# Altium footprint library LED.PcbLib: 49 footprints (part 2 of 4)
Each footprint in its own frame and in the unit in brackets; x right, y up, seen from the top. Pads: shape width x height; smd on the part's side, far side on the other; paste and mask are expansions set on the pad; w line width, h text height; cw(c..) or ccw(c..) is an arc to the next point about the centre after c.
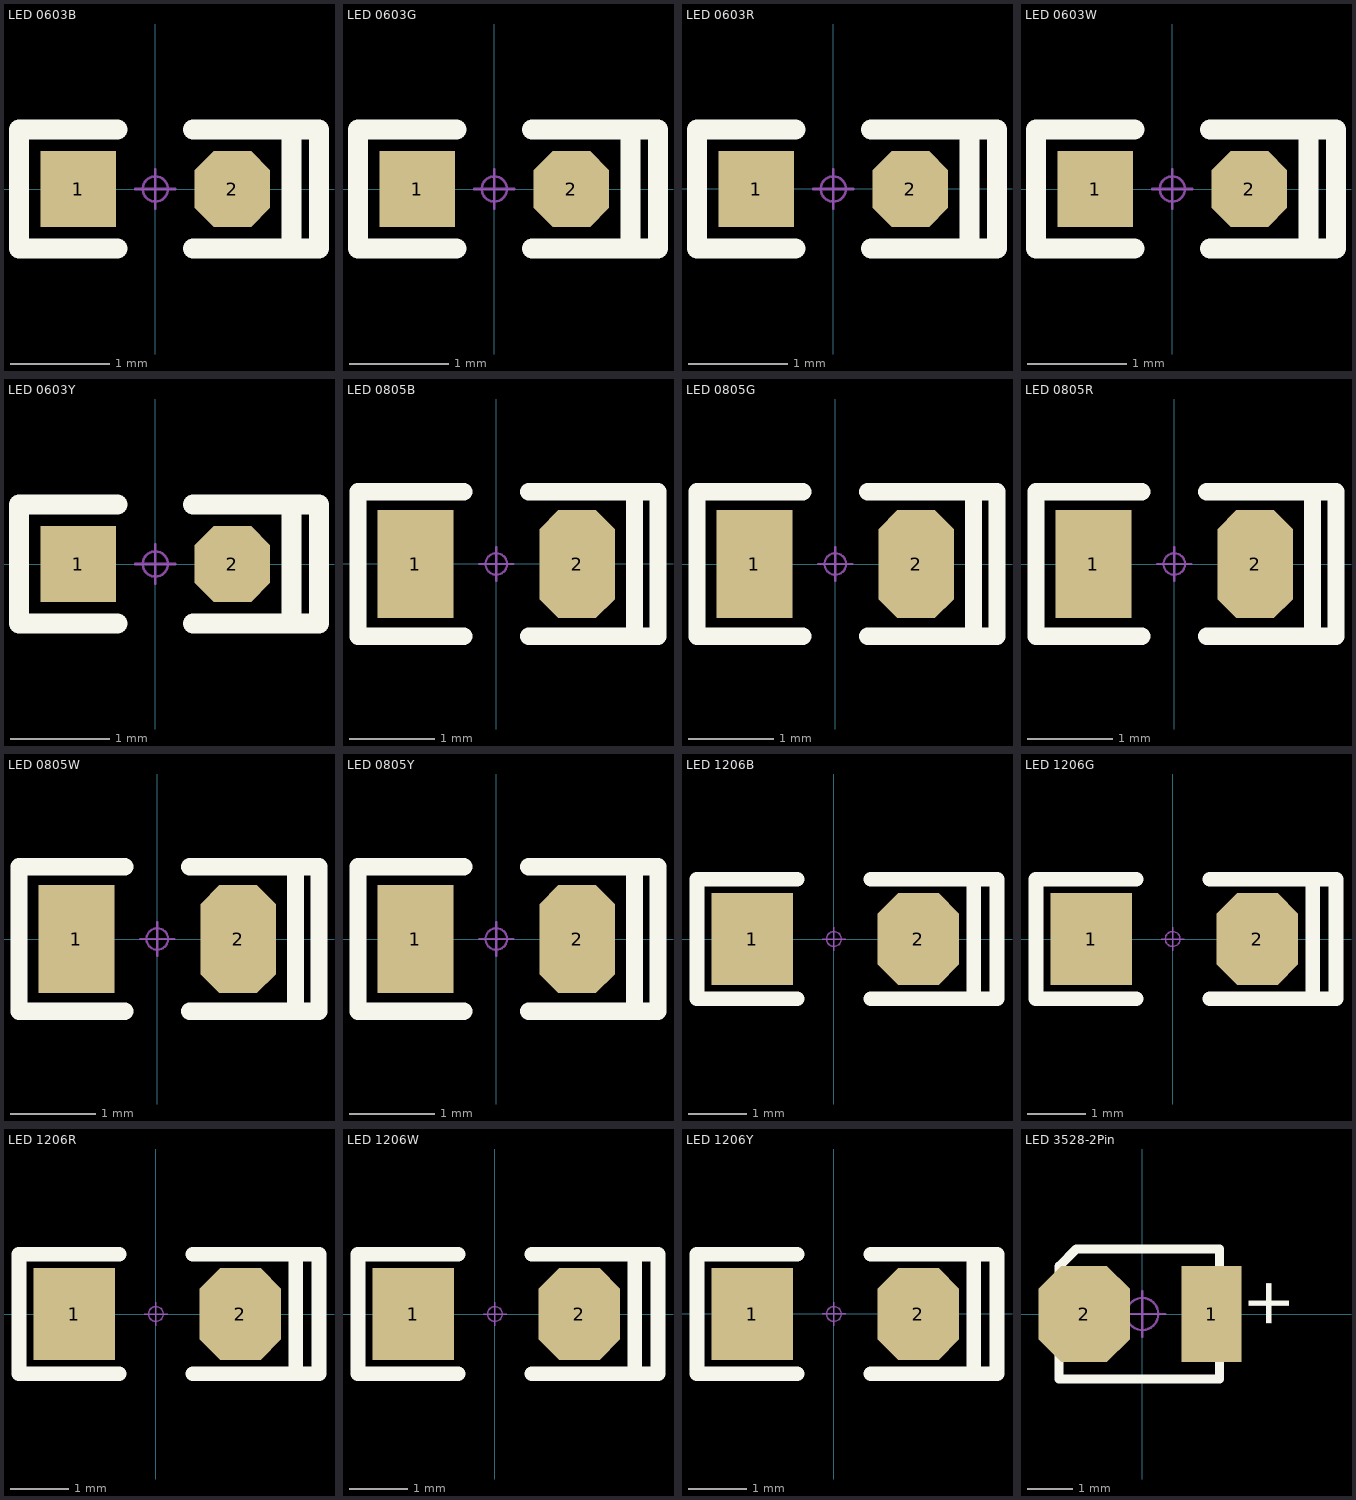
[diagram p1: the footprints below, top view; thin cyan lines are the x and y axes]

## LED 0603B [mil] "蓝色0603LED"
pads (2):
  rect 30x30 smd: 1(-30.59,0)
  oct 30x30 smd: 2(30.59,0)
Top Overlay:
  lines w8: -15,-23.62 -54.13,-23.62 -54.13,23.62 -15,23.62 ; 15,-23.62 65,-23.62 65,23.62 15,23.62 ; 54.13,-23.62 54.13,23.62
Mechanical 15:
  circle w1: c0,0 r5
  lines w1: -7.87,0 7.87,0 ; 0,-7.87 0,7.88
3D body: height 23.82, standoff 8.07, extent -23.63,-15.75 23.62,15.75
3D body: height 18.36, standoff -0.16, extent -31.49,-15.78 31.5,15.79

## LED 0603G [mil] "绿色0603LED"
pads (2):
  rect 30x30 smd: 1(-30.59,0)
  oct 30x30 smd: 2(30.59,0)
Top Overlay:
  lines w8: -15,-23.62 -54.13,-23.62 -54.13,23.63 -15,23.63 ; 15,-23.62 65,-23.62 65,23.63 15,23.63 ; 54.14,-23.62 54.14,23.63
Mechanical 15:
  circle w1: c0,0 r5
  lines w1: -7.87,0 7.88,0 ; 0,-7.87 0,7.88
3D body: height 18.36, standoff -0.16, extent -31.49,-15.79 31.5,15.79
3D body: height 23.82, standoff 8.07, extent -23.62,-15.75 23.62,15.74

## LED 0603R [mil] "红色0603LED"
pads (2):
  rect 30x30 smd: 1(-30.59,0)
  oct 30x30 smd: 2(30.59,0)
Top Overlay:
  lines w8: -15.01,-23.63 -54.14,-23.63 -54.14,23.62 -15.01,23.62 ; 14.99,-23.63 65,-23.63 65,23.62 14.99,23.62 ; 54.13,-23.63 54.13,23.62
Mechanical 15:
  circle w1: c0,0 r5
  lines w1: -7.88,0 7.87,0 ; 0,-7.88 0,7.87
3D body: height 18.36, standoff -0.16, extent -31.49,-15.78 31.5,15.79
3D body: height 23.82, standoff 8.07, extent -23.63,-15.75 23.62,15.74

## LED 0603W [mil] "白色0603LED"
pads (2):
  rect 30x30 smd: 1(-30.59,0)
  oct 30x30 smd: 2(30.59,0)
Top Overlay:
  lines w8: -15,-23.62 -54.13,-23.62 -54.13,23.62 -15,23.62 ; 15,-23.62 65,-23.62 65,23.62 15,23.62 ; 54.13,-23.62 54.13,23.62
Mechanical 15:
  circle w1: c0,0 r5
  lines w1: -7.87,0 7.87,0 ; 0,-7.87 0,7.87
3D body: height 23.82, standoff 8.07, extent -23.62,-15.75 23.62,15.75
3D body: height 18.36, standoff -0.16, extent -31.49,-15.78 31.5,15.8

## LED 0603Y [mil] "黄色0603LED"
pads (2):
  rect 30x30 smd: 1(-30.59,0)
  oct 30x30 smd: 2(30.59,0)
Top Overlay:
  lines w8: -15,-23.62 -54.13,-23.62 -54.13,23.62 -15,23.62 ; 15,-23.62 65,-23.62 65,23.62 15,23.62 ; 54.13,-23.62 54.13,23.62
Mechanical 15:
  circle w1: c0,0 r5
  lines w1: -7.87,0 7.87,0 ; 0,-7.87 0,7.87
3D body: height 18.36, standoff -0.16, extent -31.5,-16.04 31.5,15.54
3D body: height 23.82, standoff 8.07, extent -23.63,-15.75 23.62,15.74

## LED 0805B [mil] "蓝色0805LED"
pads (2):
  rect 35x50 smd: 1(-37.4,-0.01)
  oct 35x50 smd: 2(37.4,-0.01)
Top Overlay:
  lines w8: -15,-33.47 -63.98,-33.47 -63.98,33.46 -15,33.46 ; 15,-33.47 74.8,-33.47 74.8,33.46 15,33.46 ; 63.98,-33.47 63.98,32.48
Mechanical 15:
  circle w1: c0,0 r5
  lines w1: -7.87,0 7.87,0 ; 0,-7.87 0,7.87
3D body: height 31.69, standoff 12.01, extent -29.53,-24.61 29.53,24.6
3D body: height 26.33, standoff -0.16, extent -39.36,-24.64 39.37,24.65

## LED 0805G [mil] "绿色0805LED"
pads (2):
  rect 35x50 smd: 1(-37.4,0)
  oct 35x50 smd: 2(37.4,0)
Top Overlay:
  lines w8: -15,-33.46 -63.98,-33.46 -63.98,33.46 -15,33.46 ; 15,-33.46 74.8,-33.46 74.8,33.46 15,33.46 ; 63.98,-33.46 63.98,32.48
Mechanical 15:
  circle w1: c0,0 r5
  lines w1: -7.87,0 7.87,0 ; 0,-7.87 0,7.87
3D body: height 31.69, standoff 12.01, extent -29.53,-24.6 29.53,24.6
3D body: height 26.33, standoff -0.16, extent -39.37,-24.64 39.37,24.65

## LED 0805R [mil] "红色0805LED"
pads (2):
  rect 35x50 smd: 1(-37.41,0)
  oct 35x50 smd: 2(37.4,0)
Top Overlay:
  lines w8: -15,-33.46 -63.98,-33.46 -63.98,33.47 -15,33.47 ; 15,-33.46 74.8,-33.46 74.8,33.47 15,33.47 ; 63.98,-33.46 63.98,32.48
Mechanical 15:
  circle w1: c0,0 r5
  lines w1: -7.87,0 7.87,0 ; 0,-7.87 0,7.87
3D body: height 31.69, standoff 12.01, extent -29.53,-24.6 29.53,24.61
3D body: height 26.33, standoff -0.16, extent -39.37,-24.64 39.37,24.65

## LED 0805W [mm] "白色0805LED"
pads (2):
  rect 0.889x1.27 smd: 1(-0.95,0)
  oct 0.889x1.27 smd: 2(0.95,0)
Top Overlay:
  lines w0.203: -0.381,-0.85 -1.625,-0.85 -1.625,0.85 -0.381,0.85 ; 0.381,-0.85 1.9,-0.85 1.9,0.85 0.381,0.85 ; 1.625,-0.85 1.625,0.825
Mechanical 15:
  circle w0.025: c0,0 r0.127
  lines w0.025: -0.2,0 0.2,0 ; 0,-0.2 0,0.2
3D body: height 0.8, standoff 0.31, extent -0.75,-0.625 0.75,0.625
3D body: height 0.67, standoff 0, extent -1,-0.626 1,0.626

## LED 0805Y [mm] "黄色0805LED"
pads (2):
  rect 0.889x1.27 smd: 1(-0.95,0)
  oct 0.889x1.27 smd: 2(0.95,0)
Top Overlay:
  lines w0.203: -0.381,-0.85 -1.625,-0.85 -1.625,0.85 -0.381,0.85 ; 0.381,-0.85 1.9,-0.85 1.9,0.85 0.381,0.85 ; 1.625,-0.85 1.625,0.825
Mechanical 15:
  circle w0.025: c0,0 r0.127
  lines w0.025: -0.2,0 0.2,0 ; 0,-0.2 0,0.2
3D body: height 0.67, standoff 0, extent -1,-0.626 1,0.626
3D body: height 0.8, standoff 0.31, extent -0.75,-0.625 0.75,0.625

## LED 1206B [mil] "蓝色1206LED"
pads (2):
  rect 55x62 smd: 1(-55.12,0)
  oct 55x62 smd: 2(57.09,0)
Top Overlay:
  lines w10: -25,-40.35 -92.52,-40.35 -92.52,40.36 -25,40.36 ; 25,-40.35 110.24,-40.35 110.24,40.36 25,40.36 ; 94.49,-37.4 94.49,40.36
Mechanical 15:
  circle w1: c0,0 r5
  lines w1: -7.87,0 7.87,0 ; 0,-7.87 0,7.87
3D body: height 39.57, standoff 19.88, extent -44.33,-31.54 44.33,31.54
3D body: height 35.58, standoff -0.16, extent -63.03,-31.53 63.03,31.54

## LED 1206G [mil] "绿色1206LED"
pads (2):
  rect 55x62 smd: 1(-54.96,0)
  oct 55x62 smd: 2(57.24,0)
Top Overlay:
  lines w10: -24.84,-40.35 -92.36,-40.35 -92.36,40.35 -24.84,40.35 ; 25.16,-40.35 110.39,-40.35 110.39,40.35 25.16,40.35 ; 94.65,-37.4 94.65,40.35
Mechanical 15:
  circle w1: c0,0 r5
  lines w1: -7.87,0 7.87,0 ; 0,-7.87 0,7.87
3D body: height 39.57, standoff 19.88, extent -44.17,-31.54 44.48,31.53
3D body: height 35.58, standoff -0.16, extent -62.87,-31.54 63.19,31.54

## LED 1206R [mil] "红色1206LED"
pads (2):
  rect 55x62 smd: 1(-55.12,0)
  oct 55x62 smd: 2(57.09,0)
Top Overlay:
  lines w10: -25,-40.35 -92.52,-40.35 -92.52,40.35 -25,40.35 ; 25,-40.35 110.24,-40.35 110.24,40.35 25,40.35 ; 94.49,-37.4 94.49,40.35
Mechanical 15:
  circle w1: c0,0 r5
  lines w1: -7.87,0 7.87,0 ; 0,-7.87 0,7.87
3D body: height 35.58, standoff -0.16, extent -63.03,-31.54 63.03,31.54
3D body: height 39.57, standoff 19.88, extent -44.33,-31.54 44.32,31.53

## LED 1206W [mil] "白色1206LED"
pads (2):
  rect 55x62 smd: 1(-55.12,0)
  oct 55x62 smd: 2(57.09,0)
Top Overlay:
  lines w10: -25,-40.35 -92.52,-40.35 -92.52,40.35 -25,40.35 ; 25,-40.35 110.24,-40.35 110.24,40.35 25,40.35 ; 94.49,-37.4 94.49,40.35
Mechanical 15:
  circle w1: c0,0 r5
  lines w1: -7.87,0 7.87,0 ; 0,-7.87 0,7.87
3D body: height 35.58, standoff -0.16, extent -63.03,-31.54 63.03,31.54
3D body: height 39.57, standoff 19.88, extent -44.33,-31.54 44.32,31.53

## LED 1206Y [mil] "黄色1206LED"
pads (2):
  rect 55x62 smd: 1(-55.12,0)
  oct 55x62 smd: 2(57.09,0)
Top Overlay:
  lines w10: -25,-40.36 -92.52,-40.36 -92.52,40.35 -25,40.35 ; 25,-40.36 110.24,-40.36 110.24,40.35 25,40.35 ; 94.49,-37.4 94.49,40.35
Mechanical 15:
  circle w1: c0,0 r5
  lines w1: -7.87,0 7.87,0 ; 0,-7.87 0,7.87
3D body: height 35.58, standoff -0.16, extent -63.03,-31.53 63.03,31.54
3D body: height 39.57, standoff 19.88, extent -44.33,-31.54 44.33,31.53

## LED 3528-2Pin [mm] "2脚，3528LED"
pads (2):
  rect 1.3x2.1 smd: 1(1.511,0)
  oct 2x2.1 smd: 2(-1.27,0)
Top Overlay:
  lines w0.2: -1.816,-1.422 1.689,-1.422 1.689,1.422 -1.435,1.422 -1.816,1.041 -1.816,-1.422
  text "+" at 3.213,-0.356 h1.02
Mechanical 15:
  circle w0.05: c0,0 r0.35
  lines w0.05: -0.5,0 0.5,0 ; 0,-0.5 0,0.5
3D body: height 1.95, standoff 1.4, extent -1.195,-1.195 1.195,1.195
3D body: height 1.95, standoff 0.05, extent -1.75,-1.4 1.75,1.4